# Altium footprint library Indruino.PcbLib: 383 footprints (part 4 of 24)
Each footprint in its own frame and in the unit in brackets; x right, y up, seen from the top. Pads: shape width x height; smd on the part's side, far side on the other; paste and mask are expansions set on the pad; w line width, h text height; cw(c..) or ccw(c..) is an arc to the next point about the centre after c.
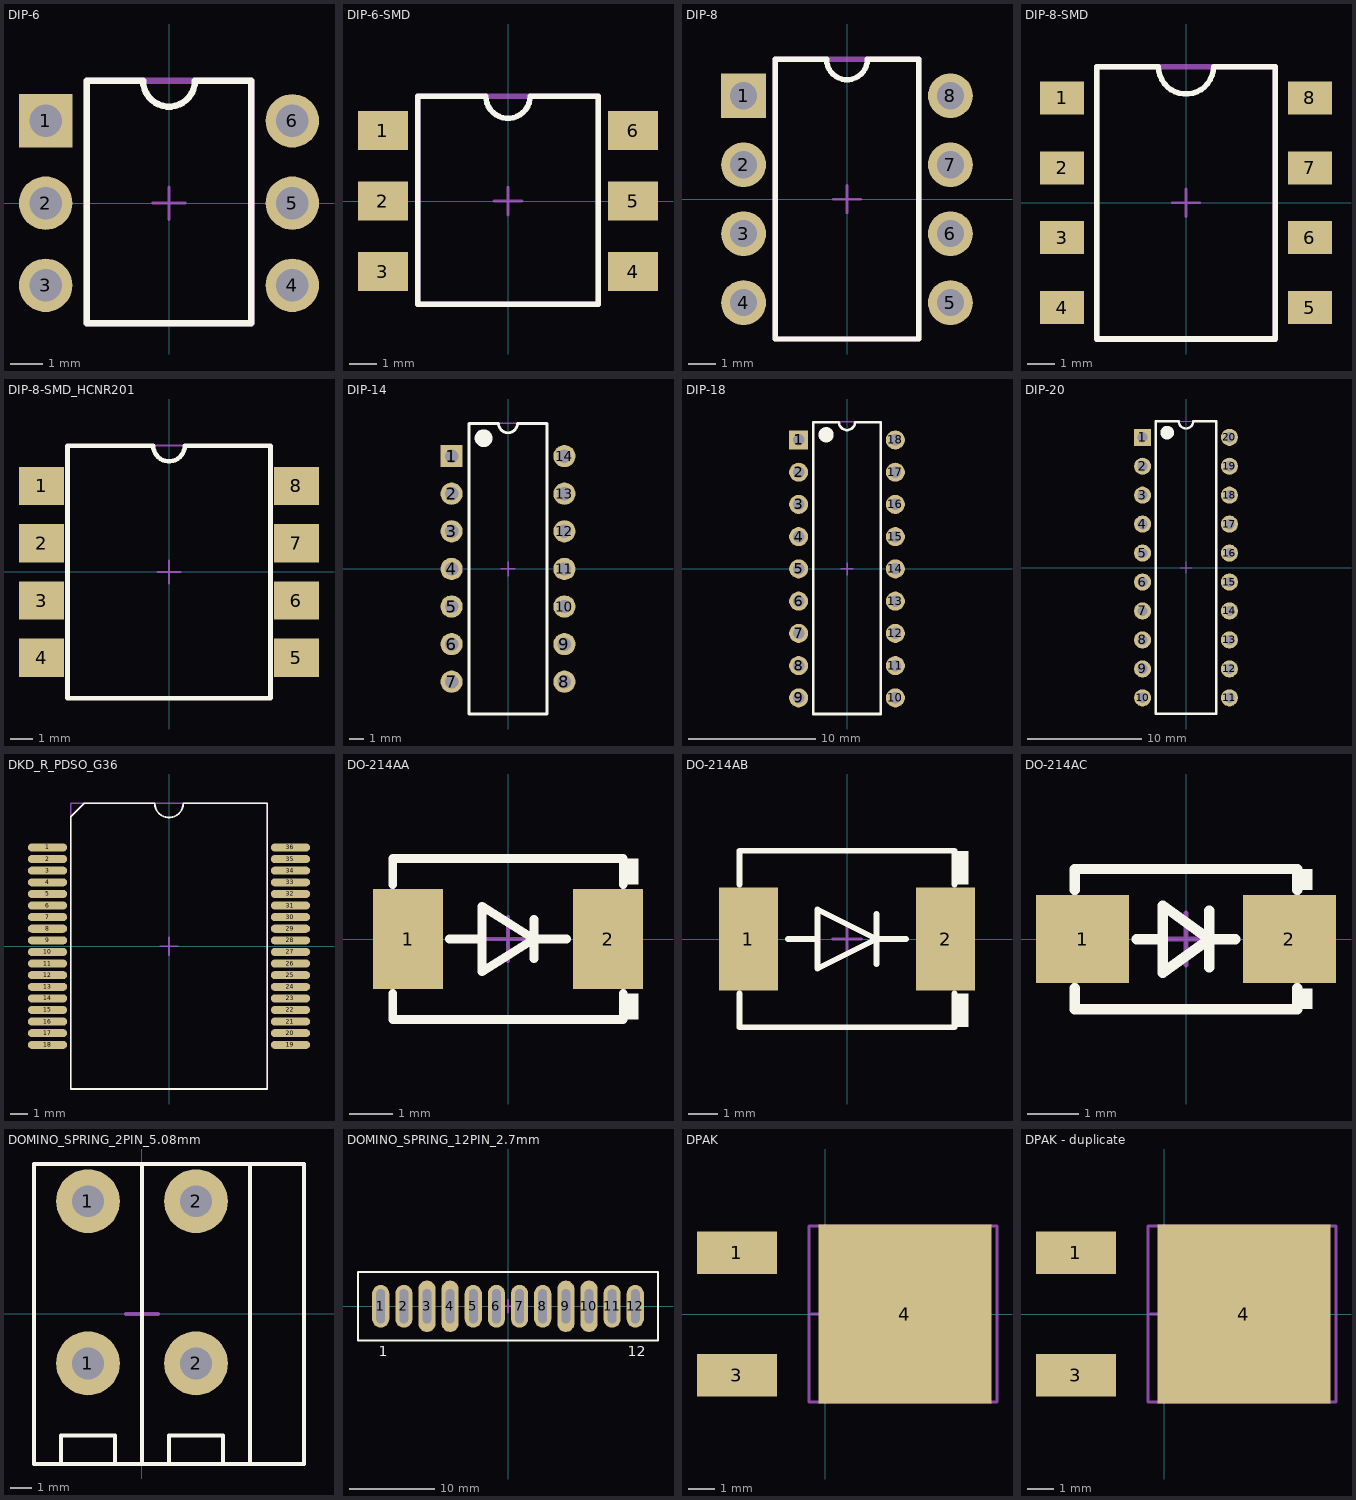
[diagram p3: the footprints below, top view; thin cyan lines are the x and y axes]

## DIP-6 [mm] "DIP, 6-Pin, Row Spacing 7.62 mm, Pitch 2.54 mm"
height 5.33
pads (6):
  rect 1.65x1.65 hole 1: 1(-3.81,2.54)
  round 1.65 hole 1: 2(-3.81,0) 3(-3.81,-2.54) 4(3.81,-2.54) 5(3.81,0) 6(3.81,2.54)
Top Overlay:
  lines w0.2: -2.54,-3.71 2.54,-3.71 2.54,3.78 0.8,3.78 cw(c0,3.78) -0.8,3.78 -2.54,3.78 -2.54,-3.71
Mechanical 13:
  lines w0.2: -2.54,-3.71 2.54,-3.71 2.54,3.78 -2.54,3.78 -2.54,-3.71
Mechanical 15:
  lines w0.1: -0.5,0 0.5,0 ; 0,-0.5 0,0.5
3D body "User Library-DIP6-White.STEP": height 4.3, standoff -3, extent -3.935,-3.5 3.935,3.62

## DIP-6-SMD [mm] "DIP, 6-Pin, Row Spacing 7.62 mm, Pitch 2.54 mm"
height 5.33
pads (6):
  rect 1.8x1.4 smd: 1(-4.5,2.54) 2(-4.5,0) 3(-4.5,-2.54) 4(4.5,-2.54) 5(4.5,0) 6(4.5,2.54)
Top Overlay:
  lines w0.2: -3.25,-3.71 -3.25,3.78 -0.8,3.78 ccw(c0,3.78) 0.8,3.78 3.25,3.78 3.25,-3.71 -3.25,-3.71
Mechanical 13:
  lines w0.2: -3.25,-3.71 -3.25,3.78 3.25,3.78 3.25,-3.71 -3.25,-3.71
Mechanical 15:
  lines w0.1: -0.5,0 0.5,0 ; 0,-0.5 0,0.5
3D body "User Library-DIP-6-SMD.step": height 3.71, standoff 0, extent -4.9,-3.61 4.9,3.64

## DIP-8 [mm] "DIP, 8-Pin, Row Spacing 7.62 mm, Pitch 2.54 mm"
height 5.33
pads (8):
  rect 1.65x1.65 hole 1: 1(-3.81,3.81)
  round 1.65 hole 1: 2(-3.81,1.27) 3(-3.81,-1.27) 4(-3.81,-3.81) 5(3.81,-3.81) 6(3.81,-1.27) 7(3.81,1.27) 8(3.81,3.81)
Top Overlay:
  lines w0.2: -2.65,-5.15 2.65,-5.15 2.65,5.15 0.75,5.15 cw(c0,5.15) -0.75,5.15 -2.65,5.15 -2.65,-5.15
Mechanical 13:
  lines w0.2: -2.65,-5.15 2.65,-5.15 2.65,5.15 -2.65,5.15 -2.65,-5.15
Mechanical 15:
  lines w0.1: -0.5,0 0.5,0 ; 0,-0.5 0,0.5
3D body "User Library-DIP-8P-M01.step": height 4.36, standoff -3, extent -3.94,-4.7 3.93,4.7

## DIP-8-SMD [mm] "DIP, 8-Pin, Row Spacing 7.62 mm, Pitch 2.54 mm"
height 5.33
pads (8):
  rect 1.6x1.2 smd: 1(-4.5,3.81) 2(-4.5,1.27) 3(-4.5,-1.27) 4(-4.5,-3.81) 5(4.5,-3.81) 6(4.5,-1.27) 7(4.5,1.27) 8(4.5,3.81)
Top Overlay:
  lines w0.2: -3.25,-4.95 3.25,-4.95 3.25,4.95 1,4.95 cw(c0,4.95) -1,4.95 -3.25,4.95 -3.25,-4.95
Mechanical 13:
  lines w0.2: -3.25,-4.95 3.25,-4.95 3.25,4.95 -3.25,4.95 -3.25,-4.95
Mechanical 15:
  lines w0.1: -0.5,0 0.5,0 ; 0,-0.5 0,0.5
3D body "6N137.STEP": height 5.09, standoff 0, extent -5.15,-4.955 5.15,4.955

## DIP-8-SMD_HCNR201 [mm] "DIP, 8-Pin, Row Spacing 7.62 mm, Pitch 2.54 mm"
height 5.33
pads (8):
  rect 2x1.7 smd: 1(-5.65,3.81) 2(-5.65,1.27) 3(-5.65,-1.27) 4(-5.65,-3.81) 5(5.65,-3.81) 6(5.65,-1.27) 7(5.65,1.27) 8(5.65,3.81)
Top Overlay:
  lines w0.2: -4.5,-5.6 -4.5,5.6 -0.7,5.6 ccw(c0,5.6) 0.7,5.6 4.5,5.6 4.5,-5.6 -4.5,-5.6
Mechanical 13:
  lines w0.1: -4.5,-5.6 4.5,-5.6 4.5,5.6 -4.5,5.6 -4.5,-5.6
Mechanical 15:
  lines w0.1: -0.5,0 0.5,0 ; 0,-0.5 0,0.5
3D body "User Library-HCNR200_SMD.STEP": height 4.75, standoff 0, extent -6.15,-5.575 6.15,5.575

## DIP-14 [mm] "DIP, 14-Pin, Row Spacing 7.62 mm, Pitch 2.54 mm"
height 5.08
pads (14):
  rect 1.5x1.5 hole 0.9: 1(-3.81,7.62)
  round 1.5 hole 0.9: 2(-3.81,5.08) 3(-3.81,2.54) 4(-3.81,0) 5(-3.81,-2.54) 6(-3.81,-5.08) 7(-3.81,-7.62) 8(3.81,-7.62) 9(3.81,-5.08) 10(3.81,-2.54) 11(3.81,0) 12(3.81,2.54) 13(3.81,5.08) 14(3.81,7.62)
Top Overlay:
  circle w0.6: c-1.65,8.83 r0.3
  lines w0.2: -2.65,-9.8 -2.65,9.83 -0.635,9.83 ccw(c0,9.83) 0.635,9.83 2.65,9.83 2.65,-9.8 -2.65,-9.8
Mechanical 13:
  lines w0.1: -2.65,-9.8 -2.65,9.85 2.65,9.85 2.65,-9.8 -2.65,-9.8
Mechanical 15:
  lines w0.1: -0.5,0 0.5,0 ; 0,-0.5 0,0.5
3D body "User Library-DIP-14P-M02.step": height 4.36, standoff -3, extent -3.935,-9.8 3.935,9.8

## DIP-18 [mm] "DIP, 18-Pin, Row Spacing 7.62 mm, Pitch 2.54 mm"
height 5.08
pads (18):
  rect 1.5x1.5 hole 0.9: 1(-3.81,10.16)
  round 1.5 hole 0.9: 2(-3.81,7.62) 3(-3.81,5.08) 4(-3.81,2.54) 5(-3.81,0) 6(-3.81,-2.54) 7(-3.81,-5.08) 8(-3.81,-7.62) 9(-3.81,-10.16) 10(3.81,-10.16) 11(3.81,-7.62) 12(3.81,-5.08) 13(3.81,-2.54) 14(3.81,0) 15(3.81,2.54) 16(3.81,5.08) 17(3.81,7.62) 18(3.81,10.16)
Top Overlay:
  circle w0.6: c-1.65,10.57 r0.3
  lines w0.2: -2.65,-11.43 2.65,-11.43 2.65,11.57 0.635,11.57 cw(c0,11.57) -0.635,11.57 -2.65,11.57 -2.65,-11.43
Mechanical 13:
  lines w0.1: -2.65,-11.43 2.65,-11.43 2.65,11.58 -2.65,11.58 -2.65,-11.43
Mechanical 15:
  lines w0.1: -0.5,0 0.5,0 ; 0,-0.5 0,0.5
3D body "User Library-DIP-18P-M02.step": height 5, standoff -3, extent -3.9,-10.95 3.97,11.05

## DIP-20 [mm] "DIP, 20-Pin, Row Spacing 7.62 mm, Pitch 2.54 mm"
height 5.08
pads (20):
  rect 1.5x1.5 hole 0.9: 1(-3.81,11.43)
  round 1.5 hole 0.9: 2(-3.81,8.89) 3(-3.81,6.35) 4(-3.81,3.81) 5(-3.81,1.27) 6(-3.81,-1.27) 7(-3.81,-3.81) 8(-3.81,-6.35) 9(-3.81,-8.89) 10(-3.81,-11.43) 11(3.81,-11.43) 12(3.81,-8.89) 13(3.81,-6.35) 14(3.81,-3.81) 15(3.81,-1.27) 16(3.81,1.27) 17(3.81,3.81) 18(3.81,6.35) 19(3.81,8.89) 20(3.81,11.43)
Top Overlay:
  circle w0.6: c-1.65,11.84 r0.3
  lines w0.2: -2.65,-12.84 -2.65,12.84 -0.635,12.84 ccw(c0,12.84) 0.635,12.84 2.65,12.84 2.65,-12.84 -2.65,-12.84
Mechanical 13:
  lines w0.1: -2.65,-12.85 -2.65,12.85 2.65,12.85 2.65,-12.85 -2.65,-12.85
Mechanical 15:
  lines w0.1: -0.5,0 0.5,0 ; 0,-0.5 0,0.5
3D body "User Library-DIP-20P-M01.step": height 4.36, standoff -3, extent -3.85,-12.35 4.02,12.25

## DKD_R_PDSO_G36 [mm] "20-Pin Small Outline Package 1.27 mm Pitch"
height 3.6
pads (36):
  oval 2.2x0.45 smd: 1(-6.8,5.525) 2(-6.8,4.875) 3(-6.8,4.225) 4(-6.8,3.575) 5(-6.8,2.925) 6(-6.8,2.275) 7(-6.8,1.625) 8(-6.8,0.975) 9(-6.8,0.325) 10(-6.8,-0.325) 11(-6.8,-0.975) 12(-6.8,-1.625) 13(-6.8,-2.275) 14(-6.8,-2.925) 15(-6.8,-3.575) 16(-6.8,-4.225) 17(-6.8,-4.875) 18(-6.8,-5.525) 19(6.8,-5.525) 20(6.8,-4.875) 21(6.8,-4.225) 22(6.8,-3.575) 23(6.8,-2.925) 24(6.8,-2.275) 25(6.8,-1.625) 26(6.8,-0.975) 27(6.8,-0.325) 28(6.8,0.325) 29(6.8,0.975) 30(6.8,1.625) 31(6.8,2.275) 32(6.8,2.925) 33(6.8,3.575) 34(6.8,4.225) 35(6.8,4.875) 36(6.8,5.525)
Top Overlay:
  lines w0.1: -5.5,-8 5.5,-8 5.5,8 0.8,8 cw(c0,8) -0.8,8 -4.75,8 -5.5,7.25 -5.5,-8
Mechanical 13:
  lines w0.1: -5.5,-8 5.5,-8 5.5,8 -5.5,8 -5.5,-8
Mechanical 15:
  lines w0.1: -0.5,0 0.5,0 ; 0,-0.5 0,0.5
3D body "User Library-HSSOP36.STEP": height 3.59, standoff -0.01, extent -7.1,-7.95 7.1,7.95

## DO-214AA [mm]
pads (2):
  rect 1.6x2.3 smd: 1(-2.3,0) 2(2.3,0)
Top Overlay:
  rectangle: 2.65,-1.85 3,-1.25
  rectangle: 2.65,1.25 3,1.85
  lines w0.2: -2.65,-1.25 -2.65,-1.85 2.65,-1.85 2.65,-1.25 ; -2.65,1.25 -2.65,1.85 2.65,1.85 2.65,1.25 ; -1.35,0 -0.6,0 ; 0.6,-0.45 0.6,0.45 ; 1.35,0 0.6,0 ; 0.6,0 -0.6,-0.75 -0.6,0.75 0.6,0
Mechanical 13:
  lines w0.1: -2.65,-1.85 -2.65,1.85 2.65,1.85 2.65,-1.85 -2.65,-1.85
Mechanical 15:
  lines w0.1: -0.5,0 0.5,0 ; 0,-0.5 0,0.5
3D body "User Library-DO-214AA_SMB.STEP": height 2.25, standoff 0, extent -2.65,-1.85 2.65,1.85

## DO-214AB [mm]
pads (2):
  rect 2x3.5 smd: 1(-3.35,0) 2(3.35,0)
Top Overlay:
  region: 4.125,-1.85 3.65,-1.85 3.65,-3 4.125,-3
  region: 4.125,3 3.65,3 3.65,1.85 4.125,1.85
  lines w0.2: -3.65,-1.85 -3.65,-3 3.65,-3 3.65,-1.85 ; -3.65,1.85 -3.65,3 3.65,3 3.65,1.85 ; -2,0 -1,0 ; 1,-0.85 1,0.85 ; 2,0 1,0 ; 1,0 -1,1 -1,-1 1,0
Mechanical 13:
  lines w0.025: -3.412,-2.968 3.7,-2.968
  lines w0.1: -3.65,-3 3.65,-3 3.65,3 -3.65,3 -3.65,-3
Mechanical 15:
  lines w0.1: -0.5,0 0.5,0 ; 0,-0.5 0,0.5
3D body "User Library-DO-214AB-SMC.STEP": height 2.45, standoff 0, extent -3.9,-2.95 3.9,2.95

## DO-214AC [mm]
pads (2):
  rect 1.8x1.7 smd: 1(-2,0) 2(2,0)
Top Overlay:
  region: 2.45,1.355 2.15,1.355 2.15,0.95 2.45,0.95
  region: 2.45,-0.95 2.15,-0.95 2.15,-1.355 2.45,-1.355
  lines w0.2: -2.15,-0.95 -2.15,-1.355 2.15,-1.355 2.15,-0.95 ; -2.15,0.95 -2.15,1.355 2.15,1.355 2.15,0.95 ; -0.95,0 -0.45,0 ; 0.45,-0.55 0.45,0.55 ; 0.95,0 0.45,0 ; 0.45,0 -0.45,-0.65 -0.45,0.65 0.45,0
Mechanical 13:
  lines w0.1: -2.15,-1.35 2.15,-1.35 2.15,1.36 -2.15,1.36 -2.15,-1.35
Mechanical 15:
  lines w0.1: -0.5,0 0.5,0 ; 0,-0.5 0,0.5
3D body "User Library-DO-214AC_SMA.STEP": height 2.2, standoff 0, extent -2.49,-1.35 2.51,1.35

## DOMINO_SPRING_2PIN_5.08mm [mm] "2PIN, 3.5mm pitch, 0.8mm pin width"
pads (4):
  round 3 hole 1.5: 1(-2.54,-2.32) 1(-2.54,5.3) 2(2.54,-2.32) 2(2.54,5.3)
Top Overlay:
  lines w0.2: -3.81,-7.05 -3.81,-5.715 -1.27,-5.715 -1.27,-7.05 ; 0,-7.05 0,7.05 ; 1.27,-7.05 1.27,-5.715 3.81,-5.715 3.81,-7.05 ; 5.08,-7.05 -5.08,-7.05 -5.08,7.05 5.08,7.05 ; 5.08,-7.05 5.08,7.05 ; 5.08,-7.05 7.62,-7.05 7.62,7.05 5.08,7.05
Mechanical 15:
  lines w0.2: -0.75,0 0.75,0 ; 0,-0.75 0,0.75
3D body "20020303h021b01lf.stp": height 13.21, standoff -3.5, extent -5.06,-7.201 7.6,7.041

## DOMINO_SPRING_12PIN_2.7mm [mm]
pads (12):
  oval 2x5 hole 4 slot 1 at 0 deg: 1(-14.85,0) 2(-12.15,0) 5(-4.05,0) 6(-1.35,0) 7(1.35,0) 8(4.05,0) 11(12.15,0) 12(14.85,0)
  oval 2x6 hole 4 slot 1 at 0 deg: 3(-9.45,0) 4(-6.75,0) 9(6.75,0) 10(9.45,0)
Top Overlay:
  lines w0.2: -17.5,-4 17.5,-4 17.5,4 -17.5,4 -17.5,-4
  text "12" at 14,-5.8 h1.2
  text "1" at -15.1,-5.8 h1.2
Mechanical 15:
  lines w0.2: -0.75,0 0.75,0 ; 0,-0.75 0,0.75
3D body: height 6.5, standoff -3, extent 11.65,-1.5 12.65,1.5
3D body: height 6.5, standoff -3, extent 14.35,-1.5 15.35,1.5
3D body: height 7.5, standoff -3, extent 6.25,-1.5 7.25,1.5
3D body: height 7.5, standoff -3, extent 8.95,-1.5 9.95,1.5
3D body: height 6.5, standoff -3, extent 0.85,-1.5 1.85,1.5
3D body: height 6.5, standoff -3, extent 3.55,-1.5 4.55,1.5
3D body: height 6.5, standoff -3, extent -4.55,-1.5 -3.55,1.5
3D body: height 6.5, standoff -3, extent -1.85,-1.5 -0.85,1.5
3D body: height 7.5, standoff -3, extent -9.95,-1.5 -8.95,1.5
3D body: height 7.5, standoff -3, extent -7.25,-1.5 -6.25,1.5
3D body: height 6.5, standoff -3, extent -12.65,-1.5 -11.65,1.5
3D body: height 6.5, standoff -3, extent -15.35,-1.5 -14.35,1.5

## DPAK [mm] "D2-PAK, 4-Leads, Body 9.2x10mm, Pitch 2.54mm, Lead Span 14.2mm, IPC Low Density"
height 4.57
pads (3):
  rect 3x1.6 smd: 1(-3.3,2.3) 3(-3.3,-2.3)
  rect 6.5x6.7 smd: 4(3,0)
Mechanical 13:
  lines w0.1: -0.6,-3.3 -0.6,3.3 6.45,3.3 6.45,-3.3 -0.6,-3.3
Mechanical 15:
  lines w0.1: -0.5,0 0.5,0 ; 0,-0.5 0,0.5
3D body "SW3dPS-DPAK-1.STEP": height 2.34, standoff -0.07, extent -4.17,-3.27 5.768,3.27

## DPAK - duplicate [mm] "D2-PAK, 4-Leads, Body 9.2x10mm, Pitch 2.54mm, Lead Span 14.2mm, IPC Low Density"
height 4.57
pads (3):
  rect 3x1.6 smd: 1(-3.3,2.3) 3(-3.3,-2.3)
  rect 6.5x6.7 smd: 4(3,0)
Mechanical 13:
  lines w0.1: -0.6,-3.3 -0.6,3.3 6.45,3.3 6.45,-3.3 -0.6,-3.3
Mechanical 15:
  lines w0.1: -0.5,0 0.5,0 ; 0,-0.5 0,0.5
3D body "SW3dPS-DPAK-1.STEP": height 2.34, standoff -0.07, extent -4.17,-3.27 5.768,3.27